# Altium schematic symbol library lib_datalogger.SchLib: 1246 symbols (part 4 of 16) (continued)
## CMP-005-000019-1 (continued)

## CMP-005-000020-1
designator CON?, comment CONN IC DIP SOCKET 14POS TIN
Manufacturer: On Shore Technology Inc; Part#: ED14DT; eVendorPrice: 0,18; eVendor#: ED3045-5-ND; MSRP: 0,07360; eVendor: Digi-Key; Datasheet: http://www.on-shore.com/sites/default/files/manuals/ipg2.pdf; Obs: --; MOQ: 5000; Source: mits.SchLib; Design Item ID: CONN IC DIP SOCKET 14POS TIN
footprint SOCKET DIP-14 (DIP; 16 Leads; Row Spacing 7.62 mm; Pitch 2.54 mm)
footprint SOCKET DIP-14 (DIP; 16 Leads; Row Spacing 7.62 mm; Pitch 2.54 mm)

## CMP-005-000021-1
designator CON?, comment CONN PWR JACK 2X5.5MM SOLDER
Manufacturer Part Number: PJ-002AH; Manufacturer: CUI Inc.; Internal Switch(s): Single Switch, Normally Closed; Mating Length/Depth: 0.354" (9.00mm); Actual Diameter: 0.078" (2.00mm ID), 0.256" (6.50mm OD); Number of Positions/Contacts: 2 Conductors, 3 Contacts; Material Flammability Rating: UL94 V-0; Industry Recognized Mating Diameter: 2.00mm ID (0.079"), 5.50mm OD (0.217"); Body Color: Black; Voltage - Rated: 24VDC; Shielding: Unshielded; Gender: Male; Current rating: 5A; Includes: 1 pc - 1 Connector; Source: mits.SchLib; Part Status: Active; Connector Type: Jack; Body Material: -; Operating Temperature: -25°C ~ 85°C; Mounting Feature: -; Insulation Color: -; Pricing 1: 1=0.74, 10=0.696, 25=0.6264, 50=0.5568, 100=0.5336, 250=0.4872, 500=0.464, 1000=0.3828, 2500=0.348 (USD); Stock 1: 37981; ComponentLink1Description: http://www.cui.com/product/resource/digikeypdf/pj-002ah.pdf; Contact Material - Plating: Nickel, Silver; ComponentLink1URL: http://www.cui.com/product/resource/digikeypdf/pj-002ah.pdf; Termination: Solder Eyelet(s); Category: Connectors, Interconnects; Thread Size: -; RoHS: RoHS Compliant; Design Item ID: CONN PWR JACK 2X5.5MM SOLDER; Contact Material: Brass; Copper Alloy; Packaging: Bulk; Housing Material: Polybutylene Terephthalate (PBT); Ingress Protection: -; Mounting Type: Through Hole, Right Angle; Features: -
footprint CONN_POWER_JACK
footprint CONN_POWER_JACK
pins: 1, 2, 3

## CMP-005-000022-1
designator CON?, comment CONN HEADER 4POS R/A W/FLANGE
Manufacturer Part Number: 1586043-4; Manufacturer: TE Connectivity AMP Connectors; Number of Positions Loaded: All; Pitch: 0.165" (4.20mm); Number of Positions: 4; Connector Type: Header, Shrouded; Source: mits.SchLib; Features: -; Packaging: Bulk; Part Status: Active; Contact Finish: Tin; Pricing 1: 1=0.66, 10=0.52, 100=0.46, 500=0.44, 1000=0.36, 2000=0.33, 5000=0.32, 25000=0.31 (USD); Color: -; Termination: Solder; Contact Mating Length: -; Design Item ID: CONN HEADER 4POS R/A W/FLANGE; Mounting Type: Through Hole, Right Angle; Number of Rows: 2; Contact Finish Thickness: -; ComponentLink1URL: http://www.te.com/commerce/DocumentDelivery/DDEController?Action=srchrtrv&DocNm=1586043&DocType=Customer+Drawing&DocLang=English; Contact Type: Male Pin; RoHS: RoHS Compliant; Category: Connectors, Interconnects; Stock 1: 2218; Fastening Type: Locking Ramp; ComponentLink1Description: http://www.te.com/commerce/DocumentDelivery/DDEController?Action=srchrtrv&DocNm=1586043&DocType=Customer+Drawing&DocLang=English; Row Spacing: 0.165" (4.20mm)
footprint CON_4POS_HEADER_RA_4.2MM (METALTEX MFPN-4)
footprint CON_4POS_HEADER_RA_4.2MM (METALTEX MFPN-4)
pins: 1, 2, 3, 4

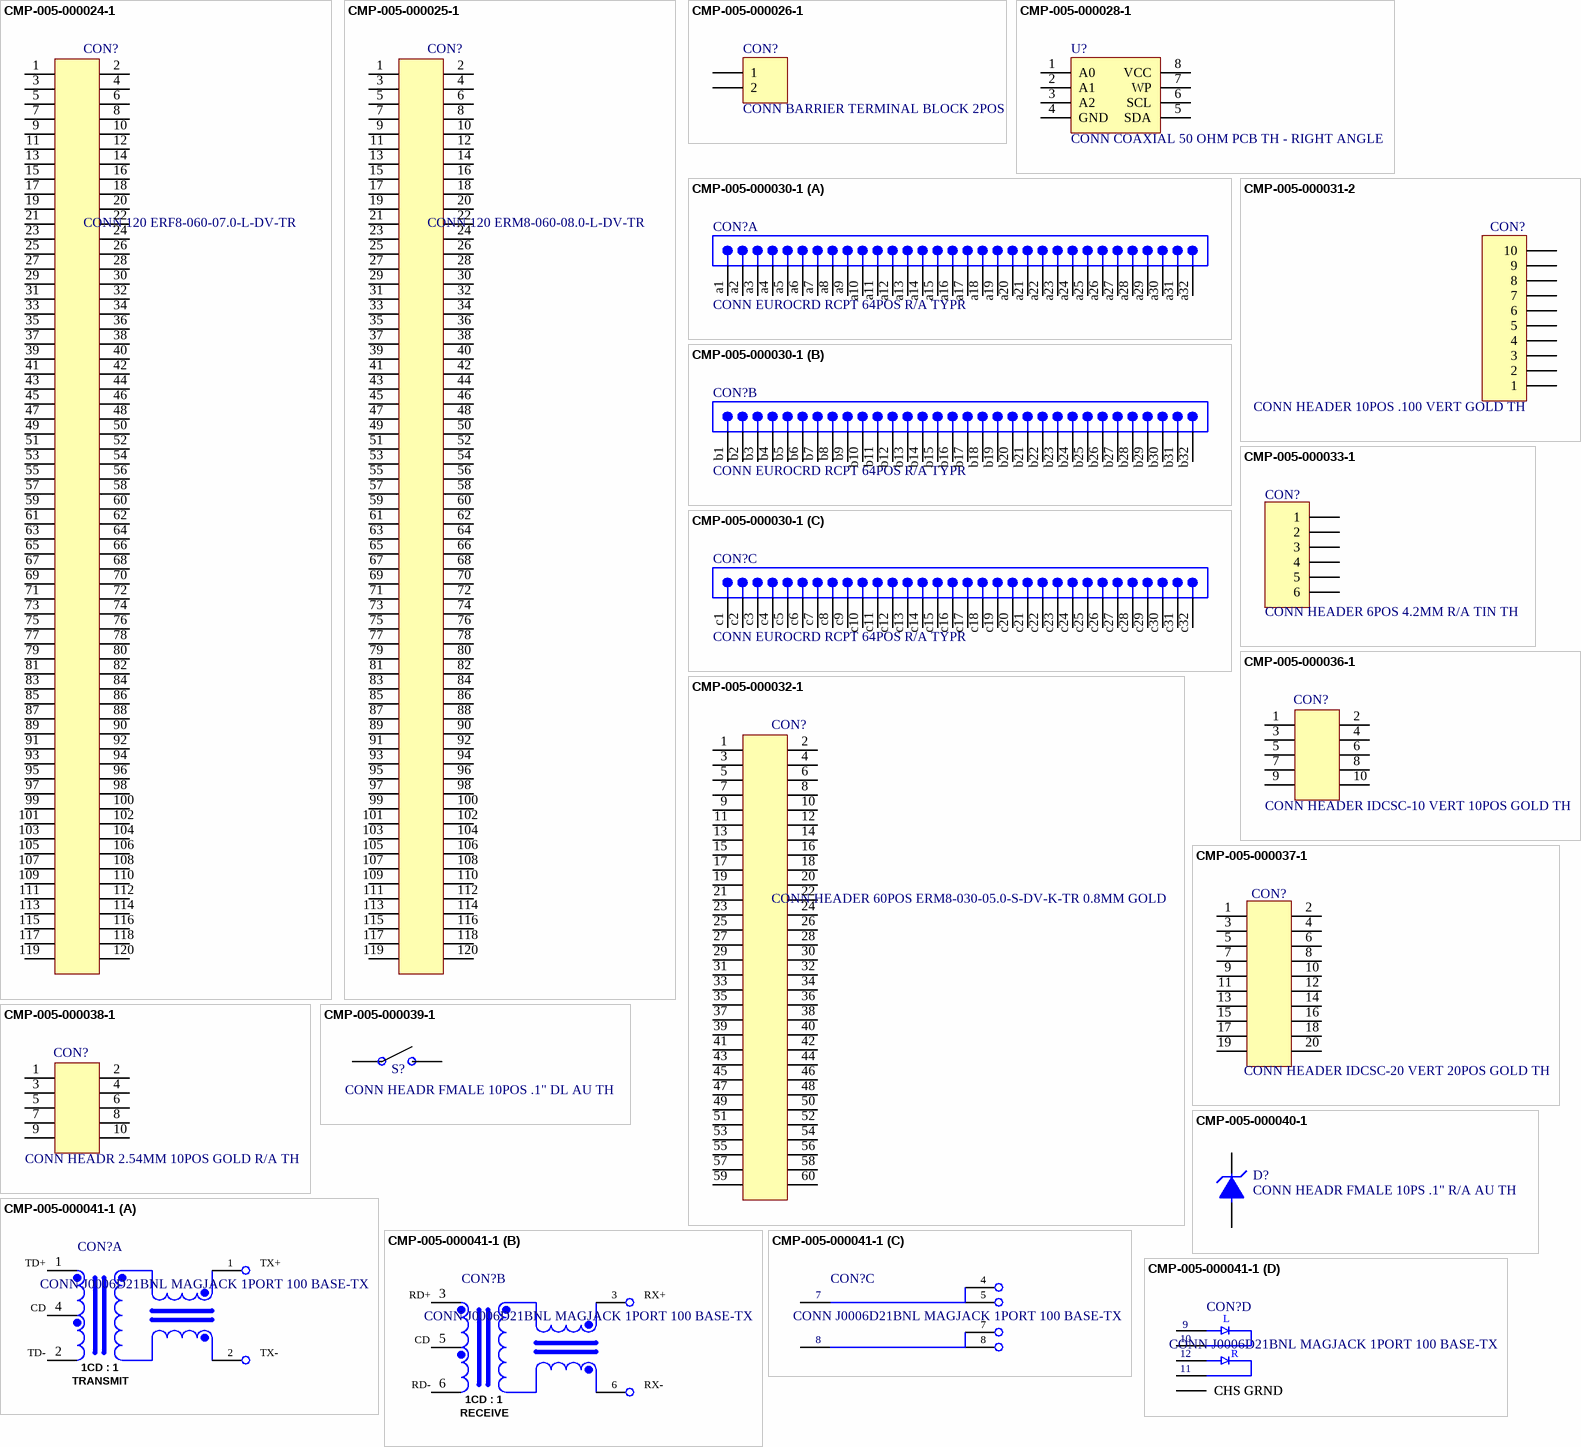
[diagram p12: symbols CMP-005-000024-1 to CMP-005-000041-1]

## CMP-005-000024-1
designator CON?, comment CONN 120 ERF8-060-07.0-L-DV-TR
Manufacturer: On Shore Technology Inc; Part#: 302-S201; MSRP: 0,18; eVendor: Digi-Key; eVendorPrice: 0,44; eVendor#: ED10524-ND; MOQ: 5000; Source: mits.SchLib; Datasheet: http://www.on-shore.com/sites/default/files/manuals/302-sxxx.pdf; Design Item ID: CONN 120 ERF8-060-07.0-L-DV-TR; Obs: --
footprint ERM8-060-08.0-L-DV-TR (Footprint not found)
footprint ERF8-060-07.0-L-DV-TR
pins: 1, 2, 3, 4, 5, 6, 7, 8, 9, 10, 11, 12, 13, 14, 15, 16, 17, 18, 19, 20, 21, 22, 23, 24, 25, 26, 27, 28, 29, 30, 31, 32, 33, 34, 35, 36, 37, 38, 39, 40, 41, 42, 43, 44, 45, 46, 47, 48, 49, 50, 51, 52, 53, 54, 55, 56, 57, 58, 59, 60, 61, 62, 63, 64, 65, 66, 67, 68, 69, 70, 71, 72, 73, 74, 75, 76, 77, 78, 79, 80, 81, 82, 83, 84, 85, 86, 87, 88, 89, 90, 91, 92, 93, 94, 95, 96, 97, 98, 99, 100, 101, 102, 103, 104, 105, 106, 107, 108, 109, 110, 111, 112, 113, 114, 115, 116, 117, 118, 119, 120

## CMP-005-000025-1
designator CON?, comment CONN 120 ERM8-060-08.0-L-DV-TR
Manufacturer: On Shore Technology Inc; Part#: 302-S201; eVendor#: ED10524-ND; eVendor: Digi-Key; eVendorPrice: 0,44; MSRP: 0,18; Obs: --; MOQ: 5000; Design Item ID: CONN 120 ERM8-060-08.0-L-DV-TR; Datasheet: http://www.on-shore.com/sites/default/files/manuals/302-sxxx.pdf; Source: mits.SchLib
footprint ERM8-060-08.0-L-DV-TR (Footprint not found)
footprint ERM8-060-08.0-L-DV-TR
pins: 1, 2, 3, 4, 5, 6, 7, 8, 9, 10, 11, 12, 13, 14, 15, 16, 17, 18, 19, 20, 21, 22, 23, 24, 25, 26, 27, 28, 29, 30, 31, 32, 33, 34, 35, 36, 37, 38, 39, 40, 41, 42, 43, 44, 45, 46, 47, 48, 49, 50, 51, 52, 53, 54, 55, 56, 57, 58, 59, 60, 61, 62, 63, 64, 65, 66, 67, 68, 69, 70, 71, 72, 73, 74, 75, 76, 77, 78, 79, 80, 81, 82, 83, 84, 85, 86, 87, 88, 89, 90, 91, 92, 93, 94, 95, 96, 97, 98, 99, 100, 101, 102, 103, 104, 105, 106, 107, 108, 109, 110, 111, 112, 113, 114, 115, 116, 117, 118, 119, 120

## CMP-005-000026-1
designator CON?, comment CONN BARRIER TERMINAL BLOCK 2POS
CONECTOR BARRIER 2POS 32A; Manufacturer 1: DEGSON; Manufacturer Part Number 1: DG65S-B-2P-3Y-00A; Number of Positions: 2; Voltage - IEC: 300; Pitch: 11 mm; Current - IEC: 30; Source: mits.SchLib; Mounting Type: Through Hole; Design Item ID: CONN BARRIER TERMINAL BLOCK 2POS
footprint MSTBA 2G
footprint Barrier terminal block 9.5mm 3P
pins: 1, 2

## CMP-005-000028-1
designator U?, comment CONN COAXIAL 50 OHM PCB TH - RIGHT ANGLE
CONN COAXIAL 50 OHM PCB TH RIGHT ANGLE; Manufacturer Part Number: 63011002124501; Manufacturer: Wurth Elektronik; Pricing 1: 1=1,99080, 10=1,53800, 30=1,42470, 100=1,27610, 500=1,20770, 1000=1,19830, 1=1,91630, 10=1,48040, 30=1,37140, 100=1,22840, 500=1,16250, 1000=1,15350, 1=10,00000, 10=7,72540, 30=7,15640, 100=6,41000, 500=6,06640, 1000=6,01910, 1=9,61310, 10=7,42650, 30=6,87950, 100=6,16200, 500=5,83170, 1000=5,78620, 1=1,29270, 10=0,99870, 30=0,92510, 100=0,82860, 500=0,78420, 1000=0,77810, 1=1,10500, 10=0,85370, 30=0,79080, 100=0,70830, 500=0,67040, 1000=0,66510, 1=11,83140, 10=9,14020, 30=8,46700, 100=7,58390, 500=7,17740, 1000=7,12140, 1=167,21530, 10=129,17980, 30=119,66550, 100=107,18480, 500=101,43880, 1000=100,64780, 1=6,30710, 10=4,87250, 30=4,51360, 100=4,04280, 500=3,82610, 1000=3,79630, 1=115,14000, 10=88,94980, 30=82,39850, 100=73,80460, 500=69,84810, 1000=69,30340, 1=13,21800, 10=10,21140, 30=9,45930, 100=8,47270, 500=8,01850, 1000=7,95600, 1=2,05180, 10=1,58510, 30=1,46840, 100=1,31520, 500=1,24470, 1000=1,23500, 1=1,52200, 10=1,17580, 30=1,08920, 100=0,97560, 500=0,92330, 1000=0,91610 (AUD); Design Item ID: CONN COAXIAL 50 OHM PCB TH - RIGHT ANGLE; RoHS: Yes; Source: mits.SchLib; Stock 1: 5601
footprint 8-DFN
footprint CON-SMA-TH_5-1814832-2-LORA - RIGHT - ANGLE
pins: 1 A0 "DEVICE ADDRES 0", 2 A1 "DEVICE ADDRES 1", 3 A2 "DEVICE ADDRES 2", 4 GND "GROUND", 5 SDA "I2C DATA", 6 SCL "I2C DATA CLOCK", 7 WP "WRITE PROTECTION", 8 VCC "3.3V VOLTAGE SUPLY"

## CMP-005-000030-1
designator CON?, comment CONN EUROCRD RCPT 64POS R/A TYPR
Manufacturer Part Number: 5650897-4; Manufacturer: TE Connectivity AMP Connectors; Pitch: 0.100" (2.54mm); Material - Insulation: Polyester Thermoplastic, Glass Filled; Number of Positions: 96; Number of Positions Loaded: 64; Material Flammability Rating: UL94 V-0; Style: R; Level, Class: 2; Connector Type: Receptacle, Female Sockets; Mounting Type: Through Hole, Right Angle; Operating Temperature: -55°C ~ 125°C; RoHS: RoHS Compliant; Design Item ID: CONN EUROCRD RCPT 64POS R/A TYPR; Number of Rows: 3; ComponentLink1URL: http://www.te.com/commerce/DocumentDelivery/DDEController?Action=srchrtrv&DocNm=5650897&DocType=Customer+Drawing&DocLang=English; Current rating: -; Packaging: Bulk; Stock 1: 140; Source: mits.SchLib; Part Status: Active; Contact Finish: Gold; Pricing 1: 1=6.91, 10=6.624, 50=5.76, 100=5.472, 250=4.896, 500=4.608, 1000=4.032, 2500=3.8304 (USD); Features: Board Lock; Category: Connectors, Interconnects; ComponentLink1Description: http://www.te.com/commerce/DocumentDelivery/DDEController?Action=srchrtrv&DocNm=5650897&DocType=Customer+Drawing&DocLang=English; Contact Finish Thickness: -; Termination: Solder
footprint Euro 96-64 RECEPTOR
footprint Euro 96-64 RECEPTOR
part A pins: a1, a2, a3, a4, a5, a6, a7, a8, a9, a10, a11, a12, a13, a14, a15, a16, a17, a18, a19, a20, a21, a22, a23, a24, a25, a26, a27, a28, a29, a30, a31, a32
part B pins: b1, b2, b3, b4, b5, b6, b7, b8, b9, b10, b11, b12, b13, b14, b15, b16, b17, b18, b19, b20, b21, b22, b23, b24, b25, b26, b27, b28, b29, b30, b31, b32
part C pins: c1, c2, c3, c4, c5, c6, c7, c8, c9, c10, c11, c12, c13, c14, c15, c16, c17, c18, c19, c20, c21, c22, c23, c24, c25, c26, c27, c28, c29, c30, c31, c32

## CMP-005-000031-2
designator CON?, comment CONN HEADER 10POS .100 VERT GOLD TH
CONN HEADER 10POS .100 VERT GOLD; Manufacturer: Molex, LLC; Manufacturer Part Number: 0022112102; Connector Type: Header, Unshrouded; Pitch: 0.100" (2.54mm); Number of Positions: 10; Number of Positions Loaded: All; Color: White; ComponentLink1URL: http://www.molex.com/pdm_docs/sd/022112102_sd.pdf; Features: -; Pricing 1: 1=1.35, 10=1.226, 50=1.1006, 100=1.0506, 250=0.95056, 500=0.87552, 1000=0.75045, 2500=0.70042, 5000=0.6654 (USD); Contact Mating Length: 0.295" (7.49mm); Termination: Solder; RoHS: RoHS Compliant; Mounting Type: Through Hole; Contact Finish: Gold; Category: Connectors, Interconnects; Stock 1: 3363; Source: mits.SchLib; ComponentLink1Description: http://www.molex.com/pdm_docs/sd/022112102_sd.pdf; Contact Finish Thickness: 20µin (0.51µm); Packaging: Bulk; Number of Rows: 1; Row Spacing: -; Design Item ID: CONN HEADER 10POS .100 VERT GOLD TH; Fastening Type: Friction Lock; Contact Type: Male Pin; Part Status: Active
footprint KK10 (Chip Resistor; Body 1.6 x 0.8 mm (LxW typ))
footprint KK10 (Chip Resistor; Body 1.6 x 0.8 mm (LxW typ))
pins: 1, 2, 3, 4, 5, 6, 7, 8, 9, 10

## CMP-005-000032-1
designator CON?, comment CONN HEADER 60POS ERM8-030-05.0-S-DV-K-TR 0.8MM GOLD
CONN HEADER 60POS 0.8MM GOLD; Manufacturer: Samtec Inc; eVendor: Digi-Key; eVendor#: SAM8612CT-ND; eVendorPrice: 6,15; MSRP: 5,264; Obs: Comprar diretamente coma  SAMTEC; Datasheet: https://www.samtec.com/technical-specifications/Default.aspx?SeriesMaster=ERM8; Source: mits.SchLib; MOQ: 50; Design Item ID: CONN HEADER 60POS ERM8-030-05.0-S-DV-K-TR 0.8MM GOLD; Part#: ERM8-030-05.0-S-DV-K-TR
footprint ERF8-030-07.0-L-DV-TR
footprint ERM8-030-05.0-S-DV-K-TR
pins: 1, 2, 3, 4, 5, 6, 7, 8, 9, 10, 11, 12, 13, 14, 15, 16, 17, 18, 19, 20, 21, 22, 23, 24, 25, 26, 27, 28, 29, 30, 31, 32, 33, 34, 35, 36, 37, 38, 39, 40, 41, 42, 43, 44, 45, 46, 47, 48, 49, 50, 51, 52, 53, 54, 55, 56, 57, 58, 59, 60

## CMP-005-000033-1
designator CON?, comment CONN HEADER 6POS 4.2MM R/A TIN TH
CONN HEADER 6POS 4.2MM R/A TIN; Manufacturer Part Number: 0039301060; Manufacturer: Molex, LLC; Shrouding: Shrouded - 4 Wall; Pitch - Mating: 0.165" (4.20mm); Number of Positions: 6; Material Flammability Rating: UL94 V-2; Contact Length - Post: 0.142" (3.60mm); Style: Board to Cable/Wire; Number of Positions Loaded: All; Ingress Protection: -; Stock 1: 58921; Current rating: -; Insulation Color: Natural; Insulation Height: 0.378" (9.60mm); Pricing 1: 1=0.96, 10=0.842, 25=0.792, 50=0.759, 100=0.726, 250=0.66, 500=0.594, 1000=0.528, 2500=0.4785 (USD); RoHS: RoHS Compliant; Mated Stacking Heights: -; Mounting Type: Through Hole, Right Angle; Contact Finish Thickness - Mating: 100µin (2.54µm); Insulation Material: Polyamide (PA66), Nylon 6/6; Contact Material: Brass; Voltage Rating: -; Applications: General Purpose, Industrial, Telecommunications; Contact Shape: Square; Contact Finish Thickness - Post: 100µin (2.54µm); ComponentLink1URL: http://www.molex.com/pdm_docs/sd/039301060_sd.pdf; Part Status: Active; Source: mits.SchLib; ComponentLink1Description: http://www.molex.com/pdm_docs/sd/039301060_sd.pdf; Number of Rows: 2; Category: Connectors, Interconnects; Operating Temperature: -; Termination: Solder; Features: Board Lock; Contact Length - Mating: -; Fastening Type: Locking Ramp; Contact Finish - Mating: Tin; Packaging: Bulk; Contact Type: Male Pin; Contact Finish - Post: Tin; Connector Type: Header; Design Item ID: CONN HEADER 6POS 4.2MM R/A TIN TH; Overall Contact Length: -; Row Spacing - Mating: 0.165" (4.20mm)
footprint CONN_HEADER_6POS_RA_4.2MM_BOARD_LOCK
pins: 1, 2, 3, 4, 5, 6

## CMP-005-000036-1
designator CON?, comment CONN HEADER IDCSC-10 VERT 10POS GOLD TH
CONN HEADER VERT 10POS GOLD; Manufacturer: On Shore Technology Inc.; Manufacturer Part Number: 302-S101; Number of Positions: 10; Material Flammability Rating: UL94 V-0; Style: Board to Cable/Wire; Row Spacing - Mating: 0.100" (2.54mm); Shrouding: Shrouded - 4 Wall; Number of Positions Loaded: All; Voltage Rating: 250V; Contact Length - Post: 0.122" (3.10mm); Current rating: 3A; Category: Connectors, Interconnects; ComponentLink1URL: http://www.on-shore.com/wp-content/uploads/2015/09/302-sxxx.pdf; Insulation Color: Black; RoHS: RoHS Compliant; Contact Finish Thickness - Post: 1.25µin (0.03µm); Insulation Height: 0.358" (9.10mm); Contact Material: Brass; Mated Stacking Heights: -; ComponentLink1Description: http://www.on-shore.com/wp-content/uploads/2015/09/302-sxxx.pdf; Contact Type: Male Pin; Connector Type: Header; Contact Finish Thickness - Mating: Flash; Pitch - Mating: 0.100" (2.54mm); Part Status: Active; Fastening Type: -; Source: mits.SchLib; Applications: -; Contact Finish - Mating: Gold; Overall Contact Length: -; Number of Rows: 2; Termination: Solder; Design Item ID: CONN HEADER IDCSC-10 VERT 10POS GOLD TH; Contact Finish - Post: Gold; Contact Shape: Square; Packaging: Tray; Insulation Material: Polyester, Glass Filled; Features: Keying Slot; Contact Length - Mating: -; Mounting Type: Through Hole; Operating Temperature: -40°C ~ 105°C; Ingress Protection: -; Pricing 1: 1=0.28, 10=0.263, 50=0.1912, 100=0.1838, 250=0.165, 500=0.1575, 1000=0.13125, 2500=0.12, 5000=0.1125 (USD); Stock 1: 40051
footprint SFH11-PBPC-D05-RA-BK
footprint IDC10M
pins: 1, 2, 3, 4, 5, 6, 7, 8, 9, 10

## CMP-005-000037-1
designator CON?, comment CONN HEADER IDCSC-20 VERT 20POS GOLD TH
CONN HEADER VERT 20POS GOLD; Manufacturer: On Shore Technology Inc.; Manufacturer Part Number: 302-S201; Style: Board to Cable/Wire; Shrouding: Shrouded - 4 Wall; Material Flammability Rating: UL94 V-0; Number of Positions Loaded: All; Pitch - Mating: 0.100" (2.54mm); Voltage Rating: 250V; Current rating: 3A; Contact Length - Post: 0.122" (3.10mm); Number of Positions: 20; Contact Material: Brass; Mounting Type: Through Hole; Applications: -; Insulation Color: Black; RoHS: RoHS Compliant; Overall Contact Length: -; Features: Keying Slot; Number of Rows: 2; Mated Stacking Heights: -; Part Status: Active; Contact Length - Mating: -; Category: Connectors, Interconnects; Termination: Solder; Contact Finish - Mating: Gold; ComponentLink1Description: http://www.on-shore.com/wp-content/uploads/2015/09/302-sxxx.pdf; Contact Finish - Post: Gold; Stock 1: 18884; Insulation Material: Polyester, Glass Filled; Design Item ID: CONN HEADER IDCSC-20 VERT 20POS GOLD TH; Contact Type: Male Pin; Pricing 1: 1=0.47, 10=0.448, 50=0.3264, 100=0.3136, 250=0.2816, 500=0.2688, 1000=0.224, 2500=0.2048, 5000=0.192 (USD); Contact Finish Thickness - Mating: Flash; Row Spacing - Mating: 0.100" (2.54mm); Insulation Height: 0.358" (9.10mm); ComponentLink1URL: http://www.on-shore.com/wp-content/uploads/2015/09/302-sxxx.pdf; Contact Finish Thickness - Post: 1.25µin (0.03µm); Fastening Type: -; Contact Shape: Square; Packaging: Tray; Connector Type: Header; Ingress Protection: -; Source: mits.SchLib; Operating Temperature: -40°C ~ 105°C
footprint IDC20M
footprint IDC20M
pins: 1, 2, 3, 4, 5, 6, 7, 8, 9, 10, 11, 12, 13, 14, 15, 16, 17, 18, 19, 20

## CMP-005-000038-1
designator CON?, comment CONN HEADR 2.54MM 10POS GOLD R/A TH
CONN HEADR 2.54MM 10POS GOLD R/A; Manufacturer: Sullins Connector Solutions; Manufacturer Part Number: SBH11-PBPC-D05-RA-BK; Pitch - Mating: 0.100" (2.54mm); Current rating: 3A; Style: Board to Board or Cable; Number of Positions Loaded: All; Connector Type: Header; Contact Length - Post: 0.126" (3.20mm); Mated Stacking Heights: 9.65mm, 11.2mm, 13.35mm, 18.35mm; Material Flammability Rating: UL94 V-0; Number of Positions: 10; Shrouding: Shrouded - 4 Wall; Contact Material: Brass; Row Spacing - Mating: 0.100" (2.54mm); Stock 1: 16305; Ingress Protection: -; Termination: Solder; Mounting Type: Through Hole, Right Angle; Contact Finish - Post: Gold; Contact Finish - Mating: Gold; Applications: -; Contact Length - Mating: -; Design Item ID: CONN HEADR 2.54MM 10POS GOLD R/A TH; ComponentLink1Description: http://sullinscorp.com/catalogs/145_PAGE118_.100_SBH11_SERIES_MALE_BOX_HDR_ST_RA_SMT.pdf; ComponentLink1URL: http://sullinscorp.com/catalogs/145_PAGE118_.100_SBH11_SERIES_MALE_BOX_HDR_ST_RA_SMT.pdf; Contact Finish Thickness - Mating: Flash; Insulation Height: 0.358" (9.10mm); Features: Keying Slot; Contact Finish Thickness - Post: Flash; Operating Temperature: -40°C ~ 105°C; Insulation Color: Black; Pricing 1: 1=0.83, 10=0.646, 25=0.6024, 50=0.5476, 100=0.4928, 250=0.41612, 500=0.3942, 1000=0.3504, 2500=0.29127 (USD); Packaging: Tray; Number of Rows: 2; Category: Connectors, Interconnects; Fastening Type: -; Part Status: Active; Overall Contact Length: -; Contact Type: Male Pin; Contact Shape: Square; Insulation Material: Polybutylene Terephthalate (PBT); Voltage Rating: -; RoHS: RoHS Compliant; Source: mits.SchLib
footprint SFH11-PBPC-D05-RA-BK
footprint SBH11-PBPC-D05-RA-BK
pins: 1, 2, 3, 4, 5, 6, 7, 8, 9, 10

## CMP-005-000039-1
designator S?, comment CONN HEADR FMALE 10POS .1" DL AU TH
CONN HEADR FMALE 10POS .1" DL AU; Manufacturer: Sullins Connector Solutions; Manufacturer Part Number: SFH11-PBPC-D05-ST-BK; Pitch - Mating: 0.100" (2.54mm); Current rating: 3A; Style: Board to Board; Connector Type: Header; Material Flammability Rating: UL94 V-0; Number of Positions: 10; Contact Length - Post: 0.126" (3.20mm); Number of Positions Loaded: All; RoHS: RoHS Compliant; Contact Finish - Mating: Gold; Row Spacing - Mating: 0.100" (2.54mm); Applications: -; Contact Material: Brass; Stock 1: 10830; ComponentLink1Description: http://sullinscorp.com/catalogs/146_PAGE119_.100_SFH11_SERIES_FEMALE_HDR_ST_RA.pdf; Number of Rows: 2; Contact Type: Female Socket; Termination: Solder; Pricing 1: 1=0.82, 10=0.678, 25=0.6276, 50=0.5648, 100=0.502, 250=0.43924, 500=0.4016, 1000=0.36395, 2500=0.3263 (USD); Ingress Protection: -; Insulation Height: 0.335" (8.51mm); Contact Finish - Post: Gold; Contact Shape: Square; Design Item ID: CONN HEADR FMALE 10POS .1" DL AU TH; Contact Finish Thickness - Mating: Flash; Fastening Type: Push-Pull; Mated Stacking Heights: -; Insulation Material: Polybutylene Terephthalate (PBT); Operating Temperature: -40°C ~ 105°C; Category: Connectors, Interconnects; Mounting Type: Through Hole; Features: Polarizing Key; Contact Finish Thickness - Post: Flash; Part Status: Active; Voltage Rating: -; Insulation Color: Black; Packaging: Tray; ComponentLink1URL: http://sullinscorp.com/catalogs/146_PAGE119_.100_SFH11_SERIES_FEMALE_HDR_ST_RA.pdf; Source: mits.SchLib
footprint SWITCH_TOGGLE_TH
footprint SFH11-PBPC-D05-ST-BK
pins: 1, 2

## CMP-005-000040-1
designator D?, comment CONN HEADR FMALE 10PS .1" R/A AU TH
CONN HEADR FMALE 10PS .1" R/A AU; Manufacturer: Sullins Connector Solutions; Manufacturer Part Number: SFH11-PBPC-D05-RA-BK; Row Spacing - Mating: 0.100" (2.54mm); Current rating: 3A; Material Flammability Rating: UL94 V-0; Number of Positions Loaded: All; Connector Type: Header; Number of Positions: 10; Style: Board to Board; Contact Length - Post: 0.106" (2.69mm); Design Item ID: CONN HEADR FMALE 10PS .1" R/A AU TH; Contact Finish - Mating: Gold; Part Status: Active; Ingress Protection: -; Features: Polarizing Key; Insulation Material: Polybutylene Terephthalate (PBT); Pitch - Mating: 0.100" (2.54mm); Contact Finish Thickness - Mating: Flash; Contact Material: Brass; Packaging: Tray; ComponentLink1URL: http://sullinscorp.com/catalogs/147_PAGE119_.100_SFH11_SERIES_FEMALE_HDR_ST_RA.pdf; Category: Connectors, Interconnects; Applications: -; Contact Finish Thickness - Post: Flash; Pricing 1: 1=1, 10=0.829, 25=0.7676, 50=0.6908, 100=0.614, 250=0.53724, 500=0.4912, 1000=0.44515, 2500=0.3991 (USD); Mated Stacking Heights: -; RoHS: RoHS Compliant; Contact Type: Female Socket; Insulation Color: Black; Stock 1: 4806; Fastening Type: Push-Pull; Operating Temperature: -40°C ~ 105°C; Source: mits.SchLib; ComponentLink1Description: http://sullinscorp.com/catalogs/147_PAGE119_.100_SFH11_SERIES_FEMALE_HDR_ST_RA.pdf; Contact Shape: Square; Number of Rows: 2; Voltage Rating: -; Mounting Type: Through Hole, Right Angle; Insulation Height: 0.236" (6.00mm); Termination: Solder; Contact Finish - Post: Gold
footprint SOD-323
footprint SFH11-PBPC-D05-RA-BK
pins: A "Anode", K "Catode"

## CMP-005-000041-1
designator CON?, comment CONN J0006D21BNL MAGJACK 1PORT 100 BASE-TX
CONN MAGJACK 1PORT 100 BASE-TX; Manufacturer: Pulse Electronics Corporation; Number of Ports: 1; Tab Direction: Down; Number of Cores per Jack: 4; Shield Material: Brass; Connector Type: RJ45; Shielding: Shielded, EMI Finger; LED Color: Green - Yellow; Applications: 10/100 Base-TX, AutoMDIX; RoHS: RoHS Compliant; Orientation: 90° Angle (Right); Part Status: Active; Mounting Type: Through Hole; Design Item ID: CONN J0006D21BNL MAGJACK 1PORT 100 BASE-TX; Operating Temperature: 0°C ~ 70°C; Source: mits.SchLib; Number of Rows: 1; Manufacturer Part Number: J0006D21BNL; Contact Finish Thickness: 15µin (0.38µm); Packaging: Bulk; Contact Material: Phosphor Bronze; Termination: Solder; Stock 1: 1477; Category: Connectors, Interconnects; Height Above Board: 0.545" (13.84mm); Housing Material: Thermoplastic; Pricing 1: 1=6.77, 10=6.486, 25=5.922, 50=5.64, 100=5.358, 250=4.794, 500=4.512, 1000=3.948, 2500=3.7506 (USD); Contact Finish: Gold; ComponentLink1URL: http://productfinder.pulseeng.com/products/datasheets/J403.pdf; ComponentLink1Description: http://productfinder.pulseeng.com/products/datasheets/J403.pdf; Features: Board Guide
footprint J0006
footprint J0006
part A pins: 1 TD+, 2 TD-, 4 CT
part B pins: 3 RD+, 5 CT, 6 RD-
part C pins: 7, 8
part D pins: 9, 10, 11, 12, SH1 CHS GRND (power), SH2 CHS GRND (power)
part A text: 1         TX+; CD; 2         TX-; 1CD : 1; TRANSMIT
part B text: 3         RX+; CD; 6         RX-; 1CD : 1; RECEIVE
part D text: L; R

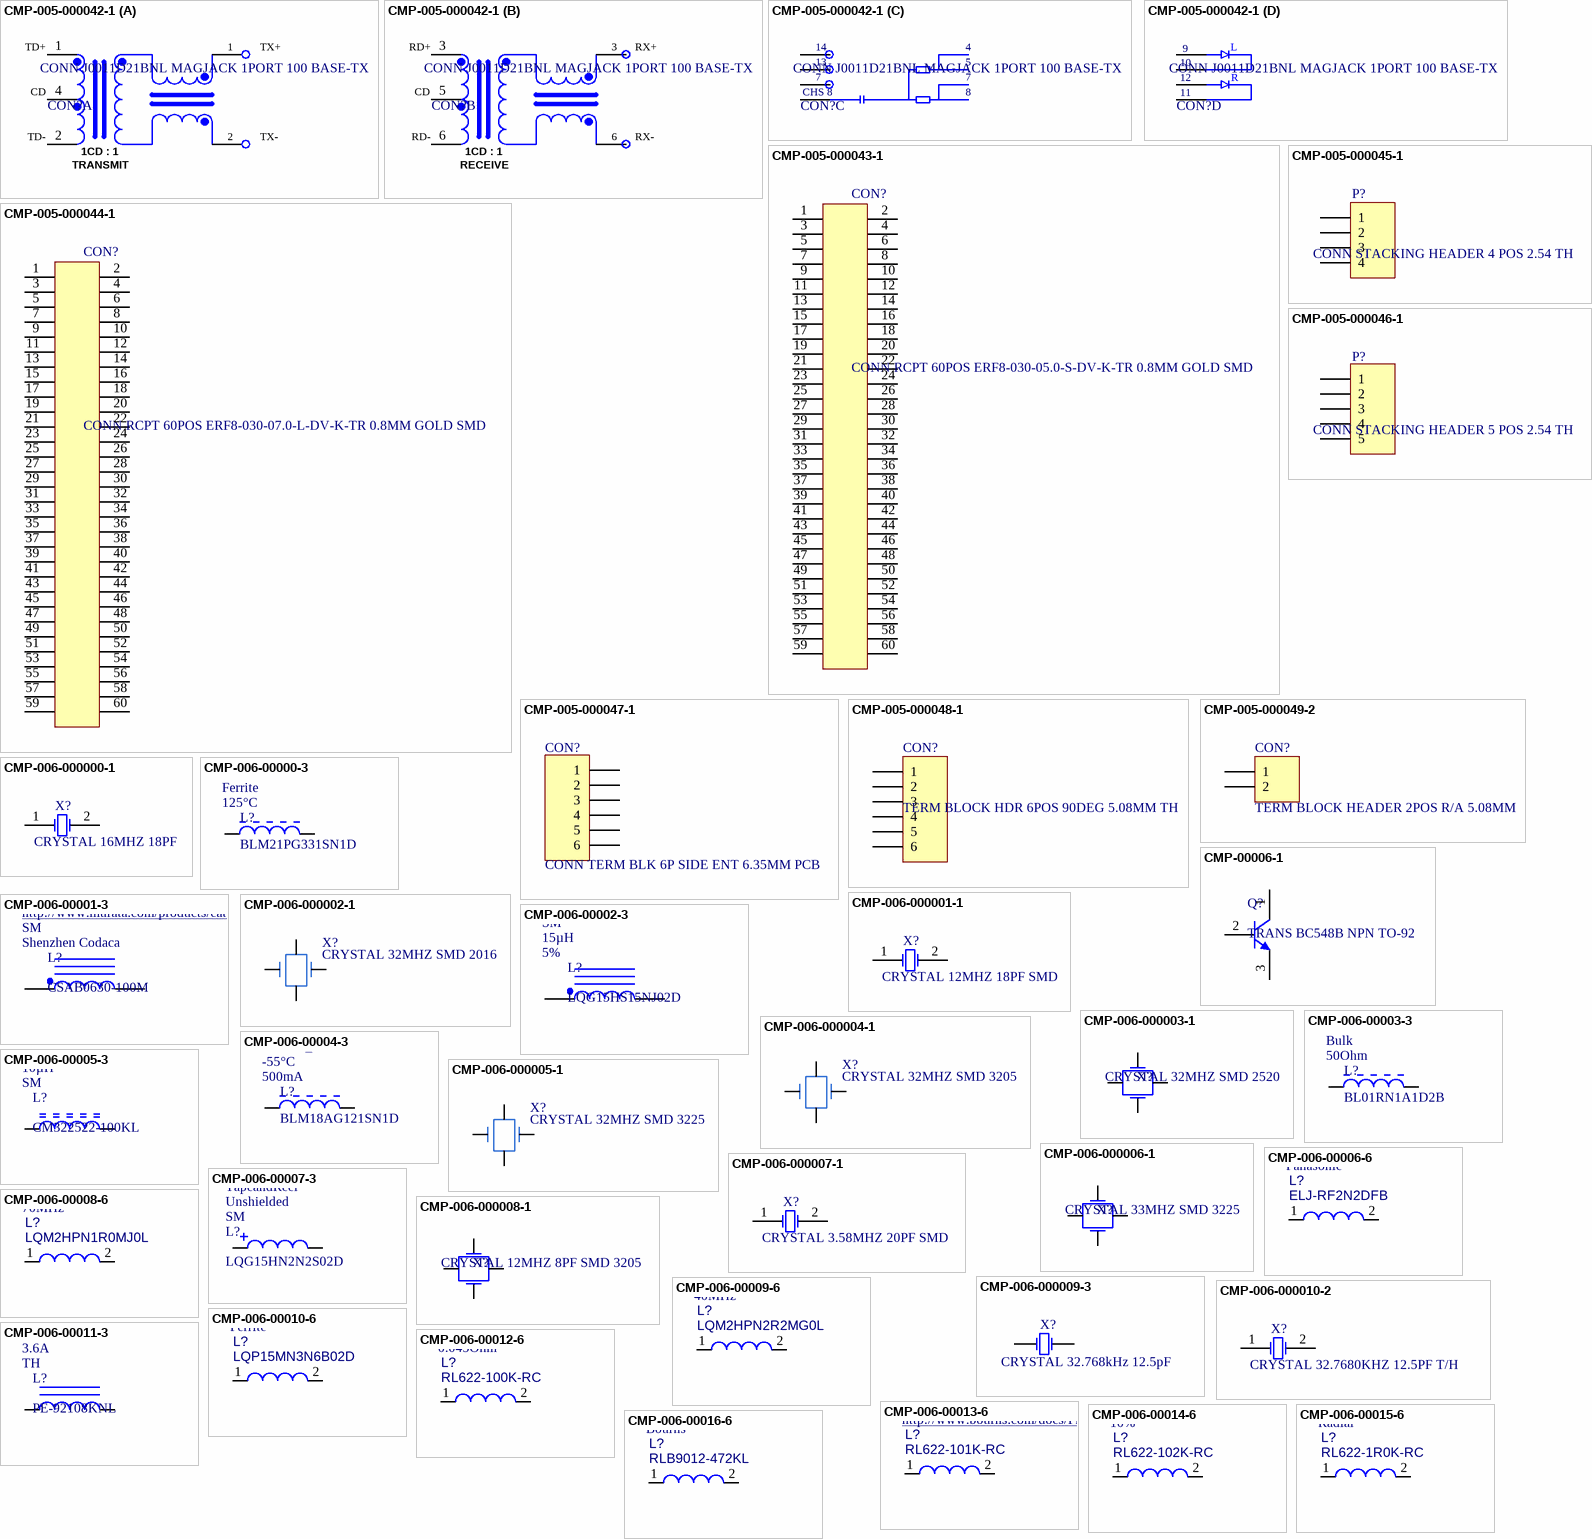
[diagram p13: symbols CMP-005-000042-1 to CMP-006-00016-6]